# Altium footprint library Switches.PcbLib: 117 footprints (part 5 of 8) (continued)
## SW_DIPTRONICS_DHA-08TQ [mm] "Pitch 1.27mm,  Body 6.2x11.29mm, 8 Ways SPST Surface-Mount DIP Switch, DIPTRONICS DHA Series" (continued)
Mechanical 14:
  lines w0.1: -0.8,-4.899 -0.8,-3.999 ; -0.8,-3.629 -0.8,-2.729 ; -0.8,-2.359 -0.8,-1.459 ; -0.8,-1.089 -0.8,-0.189 ; -0.8,0.181 -0.8,1.081 ; -0.8,1.451 -0.8,2.351 ; -0.8,2.721 -0.8,3.621 ; -0.8,3.991 -0.8,4.891 ; -0.7,-4.899 -0.7,-3.999 ; -0.7,-3.629 -0.7,-2.729 ; -0.7,-2.359 -0.7,-1.459 ; -0.7,-1.089 -0.7,-0.189 ; -0.7,0.181 -0.7,1.081 ; -0.7,1.451 -0.7,2.351 ; -0.7,2.721 -0.7,3.621 ; -0.7,3.991 -0.7,4.891 ; -0.6,-4.899 -0.6,-3.999 ; -0.6,-3.629 -0.6,-2.729 ; -0.6,-2.359 -0.6,-1.459 ; -0.6,-1.089 -0.6,-0.189 ; -0.6,0.181 -0.6,1.081 ; -0.6,1.451 -0.6,2.351 ; -0.6,2.721 -0.6,3.621 ; -0.6,3.991 -0.6,4.891 ; -0.5,-4.899 -0.5,-3.999 ; -0.5,-3.629 -0.5,-2.729 ; -0.5,-2.359 -0.5,-1.459 ; -0.5,-1.089 -0.5,-0.189 ; -0.5,0.181 -0.5,1.081 ; -0.5,1.451 -0.5,2.351 ; -0.5,2.721 -0.5,3.621 ; -0.5,3.991 -0.5,4.891 ; -0.4,-4.899 -0.4,-3.999 ; -0.4,-3.629 -0.4,-2.729 ; -0.4,-2.359 -0.4,-1.459 ; -0.4,-1.089 -0.4,-0.189 ; -0.4,0.181 -0.4,1.081 ; -0.4,1.451 -0.4,2.351 ; -0.4,2.721 -0.4,3.621 ; -0.4,3.991 -0.4,4.891 ; -0.3,-4.899 -0.3,-3.999 ; -0.3,-3.629 -0.3,-2.729 ; -0.3,-2.359 -0.3,-1.459 ; -0.3,-1.089 -0.3,-0.189 ; -0.3,0.181 -0.3,1.081 ; -0.3,1.451 -0.3,2.351 ; -0.3,2.721 -0.3,3.621 ; -0.3,3.991 -0.3,4.891 ; -0.2,-4.899 -0.2,-3.999 ; -0.2,-3.629 -0.2,-2.729 ; -0.2,-2.359 -0.2,-1.459 ; -0.2,-1.089 -0.2,-0.189 ; -0.2,0.181 -0.2,1.081 ; -0.2,1.451 -0.2,2.351 ; -0.2,2.721 -0.2,3.621 ; -0.2,3.991 -0.2,4.891 ; -0.1,-4.899 -0.1,-3.999 ; -0.1,-3.629 -0.1,-2.729 ; -0.1,-2.359 -0.1,-1.459 ; -0.1,-1.089 -0.1,-0.189 ; -0.1,0.181 -0.1,1.081 ; -0.1,1.451 -0.1,2.351 ; -0.1,2.721 -0.1,3.621 ; -0.1,3.991 -0.1,4.891 ; 0,-4.899 0,-3.999 ; 0,-3.629 0,-2.729 ; 0,-2.359 0,-1.459 ; 0,-1.089 0,-0.189 ; 0,0.181 0,1.081 ; 0,1.451 0,2.351 ; 0,2.721 0,3.621 ; 0,3.991 0,4.891 ; 0.1,-4.899 0.1,-3.999 ; 0.1,-3.629 0.1,-2.729 ; 0.1,-2.359 0.1,-1.459 ; 0.1,-1.089 0.1,-0.189 ; 0.1,0.181 0.1,1.081 ; 0.1,1.451 0.1,2.351 ; 0.1,2.721 0.1,3.621 ; 0.1,3.991 0.1,4.891 ; -0.9,-4.899 -0.9,-3.999 ; -0.9,-4.899 0.9,-4.899 0.9,-3.999 -0.9,-3.999 ; -0.9,-4.899 -0.9,-3.999 ; -0.9,-3.629 -0.9,-2.729 ; -0.9,-3.629 0.9,-3.629 0.9,-2.729 -0.9,-2.729 ; -0.9,-3.629 -0.9,-2.729 ; -0.9,-2.359 -0.9,-1.459 ; -0.9,-2.359 0.9,-2.359 0.9,-1.459 -0.9,-1.459 ; -0.9,-2.359 -0.9,-1.459 ; -0.9,-1.089 -0.9,-0.189 ; -0.9,-1.089 0.9,-1.089 0.9,-0.189 -0.9,-0.189 ; -0.9,-1.089 -0.9,-0.189 ; -0.9,0.181 -0.9,1.081 ; -0.9,0.181 -0.9,1.081 ; -0.9,0.181 0.9,0.181 0.9,1.081 -0.9,1.081 ; -0.9,1.451 -0.9,2.351 ; -0.9,1.451 -0.9,2.351 ; -0.9,1.451 0.9,1.451 0.9,2.351 -0.9,2.351 ; -0.9,2.721 -0.9,3.621 ; -0.9,2.721 -0.9,3.621 ; -0.9,2.721 0.9,2.721 0.9,3.621 -0.9,3.621 ; -0.9,3.991 -0.9,4.891 ; -0.9,3.991 -0.9,4.891 ; -0.9,3.991 0.9,3.991 0.9,4.891 -0.9,4.891 ; -3.1,-5.645 3.1,-5.645 3.1,5.635 -3.1,5.635 -3.1,-5.645
  text "1" at -2.276,4.699 h1
  text "2" at -2.276,3.429 h1
  text "ON" at 1.28,5.08 h1
  text "3" at -2.276,2.159 h1
  text "4" at -2.276,0.889 h1
  text "5" at -2.276,-0.381 h1
  text "6" at -2.276,-1.651 h1
  text "7" at -2.276,-2.921 h1
  text "8" at -2.276,-4.191 h1
Mechanical 15:
  lines w0.05: -4.695,-5.895 -4.695,5.895 4.695,5.895 4.695,-5.895 -4.695,-5.895
3D body "SW_DIPTRONICS_DHA-08TQ.stp": height 2.36, standoff 0, extent -4.05,-5.645 4.051,5.645

## SW_EAO_1K2-09.032 [mm] "Body 10x2.5mm, SPDT Switch - PCB Mounting - EAO Series 1K2"
height 8.1
pads (3):
  round 1.6 hole 0.9: 1(0,0) 2(0,-2.54) 3(0,2.54)
Top Overlay:
  circle w0.2: c0,4.023 r0.4
  circle w0.4: c0,5.7 r0.2
  lines w0.2: -1.25,3.046 -0.9,3.046 ; -1.1,-2.154 -1.2,-2.154 -1.2,0.246 -1.1,0.246 ; -0.498,-1.002 ccw(c0,-0.954) 0.498,-1.002 ; 0.9,3.046 1.25,3.046 ; 1.1,-2.154 1.2,-2.154 1.2,0.246 1.1,0.246 ; -1.25,-5 -1.25,5 1.25,5 1.25,-5 -1.25,-5
Mechanical 14:
  circle w0.1: c0,4.023 r0.5
  circle w0.1: c0,-0.954 r0.5
  lines w0.1: -1.25,3.046 1.25,3.046 ; -1.25,-5 -1.25,5 1.25,5 1.25,-5 -1.25,-5 ; -1.2,-2.154 -1.2,0.246 1.2,0.246 1.2,-2.154 -1.2,-2.154
3D body "SW_EAO_1K2-09.032.stp": height 6.4, standoff -3.8, extent -1.25,-5 1.25,5

## SW_EAO_09.10201.02 [mm] "Body 10x2.5mm, Right Angled SPDT Switch - PCB Mounting - EAO Series 1K2"
height 2.5
pads (3):
  round 1.4 hole 0.9: 1(0,0) 2(0,-2.54) 3(0,2.54)
Top Overlay:
  circle w0.4: c0,5.7 r0.2
  lines w0.2: -5.7,-5 -5.7,5 -0.7,5 -0.7,4.5 -1.2,4.5 -1.2,-4.5 -0.7,-4.5 -0.7,-5 -6.1,-5 -6.6,-1.9 -7.1,-1.9 -7.1,0.5 -6.6,0.5 -6.1,3.6 -5.7,3.6
Mechanical 8:
  lines w0.1: -1,-2.54 0,-2.54 ; -1,0 0,0 ; -1,2.54 0,2.54 ; 0,-3.54 0,-2.54 ; 0,-1.54 0,-2.54 ; 0,-1 0,0 ; 0,1 0,0 ; 0,1.54 0,2.54 ; 0,3.54 0,2.54 ; 1,-2.54 0,-2.54 ; 1,0 0,0 ; 1,2.54 0,2.54
Mechanical 14:
  lines w0.1: -5.7,-5 -5.7,5 -0.7,5 -0.7,4.5 -1.2,4.5 -1.2,-4.5 -0.7,-4.5 -0.7,-5 -6.1,-5 -6.6,-1.9 -7.1,-1.9 -7.1,0.5 -6.6,0.5 -6.1,3.6 -5.7,3.6
3D body "SW_EAO_09.10201.02.stp": height 2.5, standoff -3.5, extent -7.1,-5 0.3,5

## SW_EOZ-INTERDIL_09.20000.39 [mm] "10.16x5mm, DPST DIP Switch, (Output in Sealed, and Wave Soldering) INTERDIL Series, EOZ / INTERDIL Series"
height 8.2
pads (4):
  round 1.5 hole 0.8: 1(-3.81,1.27) 2(3.81,1.27) 3(-3.81,-1.27) 4(3.81,-1.27)
Top Overlay:
  lines w0.2: 0.109,-0.52 -2.5,-0.52 -2.5,-2.02 0.115,-2.02 ; 0.109,0.52 -2.5,0.52 -2.5,2.02 0.115,2.02 ; 1.045,-2.02 2.5,-2.02 2.5,-0.52 1.051,-0.52 ; 1.045,2.02 2.5,2.02 2.5,0.52 1.051,0.52 ; -5.08,-2.5 5.08,-2.5 5.08,2.5 -5.08,2.5 -5.08,-2.5 ; 0.08,-2.4 0.18,-1.3 0.08,-0.2 1.08,-0.2 0.98,-1.3 1.08,-2.4 0.08,-2.4 ; 0.08,0.2 0.18,1.3 0.08,2.4 1.08,2.4 0.98,1.3 1.08,0.2 0.08,0.2
Mechanical 8:
  lines w0.1: -4.81,-1.27 -3.81,-1.27 ; -4.81,1.27 -3.81,1.27 ; -3.81,-2.27 -3.81,-1.27 ; -3.81,-0.27 -3.81,-1.27 ; -3.81,0.27 -3.81,1.27 ; -3.81,2.27 -3.81,1.27 ; -2.81,-1.27 -3.81,-1.27 ; -2.81,1.27 -3.81,1.27 ; -1,0 0,0 ; 0,-1 0,0 ; 0,1 0,0 ; 1,0 0,0 ; 2.81,-1.27 3.81,-1.27 ; 2.81,1.27 3.81,1.27 ; 3.81,-2.27 3.81,-1.27 ; 3.81,-0.27 3.81,-1.27 ; 3.81,0.27 3.81,1.27 ; 3.81,2.27 3.81,1.27 ; 4.81,-1.27 3.81,-1.27 ; 4.81,1.27 3.81,1.27
Mechanical 14:
  lines w0.1: 0.109,-0.52 -2.5,-0.52 -2.5,-2.02 0.115,-2.02 ; 0.109,0.52 -2.5,0.52 -2.5,2.02 0.115,2.02 ; 1.045,-2.02 2.5,-2.02 2.5,-0.52 1.051,-0.52 ; 1.045,2.02 2.5,2.02 2.5,0.52 1.051,0.52 ; -5.08,-2.5 5.08,-2.5 5.08,2.5 -5.08,2.5 -5.08,-2.5 ; 0.08,-2.4 0.18,-1.3 0.08,-0.2 1.08,-0.2 0.98,-1.3 1.08,-2.4 0.08,-2.4 ; 0.08,0.2 0.18,1.3 0.08,2.4 1.08,2.4 0.98,1.3 1.08,0.2 0.08,0.2
3D body "SW_EOZ-INTERDIL_09.20000.39.stp": height 8.2, standoff -3.6, extent -5.08,-2.5 5.08,2.5

## SW_EOZ-INTERDIL_09.40000.03 [mm] "10.16x5mm, Coupled SPST DIP Switch, 1NO + 1NF, INTERDIL Series"
height 8.2
pads (4):
  round 1.5 hole 0.8: 1(-3.81,1.27) 2(3.81,1.27) 3(-3.81,-1.27) 4(3.81,-1.27)
Top Overlay:
  lines w0.2: 0.109,-0.52 -2.5,-0.52 -2.5,-2.02 0.115,-2.02 ; 0.109,0.52 -2.5,0.52 -2.5,2.02 0.115,2.02 ; 1.045,-2.02 2.5,-2.02 2.5,-0.52 1.051,-0.52 ; 1.045,2.02 2.5,2.02 2.5,0.52 1.051,0.52 ; -5.08,-2.5 5.08,-2.5 5.08,2.5 -5.08,2.5 -5.08,-2.5 ; 0.08,-2.4 0.18,-1.3 0.08,-0.2 1.08,-0.2 0.98,-1.3 1.08,-2.4 0.08,-2.4 ; 0.08,0.2 0.18,1.3 0.08,2.4 1.08,2.4 0.98,1.3 1.08,0.2 0.08,0.2
Mechanical 8:
  lines w0.1: -4.81,-1.27 -3.81,-1.27 ; -4.81,1.27 -3.81,1.27 ; -3.81,-2.27 -3.81,-1.27 ; -3.81,-0.27 -3.81,-1.27 ; -3.81,0.27 -3.81,1.27 ; -3.81,2.27 -3.81,1.27 ; -2.81,-1.27 -3.81,-1.27 ; -2.81,1.27 -3.81,1.27 ; -1,0 0,0 ; 0,-1 0,0 ; 0,1 0,0 ; 1,0 0,0 ; 2.81,-1.27 3.81,-1.27 ; 2.81,1.27 3.81,1.27 ; 3.81,-2.27 3.81,-1.27 ; 3.81,-0.27 3.81,-1.27 ; 3.81,0.27 3.81,1.27 ; 3.81,2.27 3.81,1.27 ; 4.81,-1.27 3.81,-1.27 ; 4.81,1.27 3.81,1.27
Mechanical 14:
  lines w0.1: 0.109,-0.52 -2.5,-0.52 -2.5,-2.02 0.115,-2.02 ; 0.109,0.52 -2.5,0.52 -2.5,2.02 0.115,2.02 ; 1.045,-2.02 2.5,-2.02 2.5,-0.52 1.051,-0.52 ; 1.045,2.02 2.5,2.02 2.5,0.52 1.051,0.52 ; -5.08,-2.5 5.08,-2.5 5.08,2.5 -5.08,2.5 -5.08,-2.5 ; 0.08,-2.4 0.18,-1.3 0.08,-0.2 1.08,-0.2 0.98,-1.3 1.08,-2.4 0.08,-2.4 ; 0.08,0.2 0.18,1.3 0.08,2.4 1.08,2.4 0.98,1.3 1.08,0.2 0.08,0.2
3D body "SW_EOZ-INTERDIL_09.40000.03.stp": height 8.2, standoff -3.6, extent -5.08,-2.5 5.08,2.5

## SW_ERG_DS16C1-8 [mm] "PackageDescription  Body 22.7x9.9mm, Pitch 2.54mm, 1 Pole 8 Ways (SP8T), Thru Hole DIP Switch, ERG DS16C Serie"
height 9.3
pads (16):
  round 1.3 hole 0.8: 1(-3.81,8.89) 2(-3.81,6.35) 3(-3.81,3.81) 4(-3.81,1.27) 5(-3.81,-1.27) 6(-3.81,-3.81) 7(-3.81,-6.35) 8(-3.81,-8.89) 9(3.81,-8.89) 10(3.81,-6.35) 11(3.81,-3.81) 12(3.81,-1.27) 13(3.81,1.27) 14(3.81,3.81) 15(3.81,6.35) 16(3.81,8.89)
Top Overlay:
  lines w0.2: -4,-9.821 -4,-10.5 4,-10.5 4,-9.821 ; -4,-7.959 -4,-7.281 ; -4,-5.419 -4,-4.741 ; -4,-2.879 -4,-2.201 ; -4,-0.339 -4,0.339 ; -4,2.201 -4,2.879 ; -4,4.741 -4,5.419 ; -4,7.281 -4,7.959 ; -4,9.821 -4,10.5 4,10.5 4,9.821 ; -1.6,-7.35 1.6,-7.35 ; -1.6,-6.86 1.6,-6.86 ; -1.6,-6.68 1.6,-6.68 ; -1.6,-6.02 1.6,-6.02 ; -1.6,-5.84 1.6,-5.84 ; -1.6,-5.35 1.6,-5.35 ; -0.4,-9.4 -0.4,-7.35 ; -0.4,-5.35 -0.4,9.4 ; 0.4,-9.4 0.4,-7.35 ; 0.4,-5.35 0.4,9.4 ; 4,-7.959 4,-7.281 ; 4,-5.419 4,-4.741 ; 4,-2.879 4,-2.201 ; 4,-0.339 4,0.339 ; 4,2.201 4,2.879 ; 4,4.741 4,5.419 ; 4,7.281 4,7.959 ; -4.95,-11.7 4.95,-11.7 4.95,11 -4.95,11 -4.95,-11.7 ; -1.6,-9.4 -1.6,9.4 1.6,9.4 1.6,-9.4 -1.6,-9.4
  text "8" at -2.867,-8.509 h1
  text "7" at -2.867,-5.969 h1
  text "6" at -2.867,-3.429 h1
  text "4" at -2.867,1.651 h1
  text "5" at -2.867,-0.889 h1
  text "2" at -2.867,6.731 h1
  text "3" at -2.867,4.191 h1
  text "1" at -2.867,9.017 h1
Mechanical 8:
  lines w0.1: -0.5,0 0,0 ; 0,-0.5 0,0 ; 0,0.5 0,0 ; 0.5,0 0,0
Mechanical 14:
  lines w0.1: -4.31,-8.89 -3.81,-8.89 ; -4.31,-6.35 -3.81,-6.35 ; -4.31,-3.81 -3.81,-3.81 ; -4.31,-1.27 -3.81,-1.27 ; -4.31,1.27 -3.81,1.27 ; -4.31,3.81 -3.81,3.81 ; -4.31,6.35 -3.81,6.35 ; -4.31,8.89 -3.81,8.89 ; -3.81,-9.39 -3.81,-8.89 ; -3.81,-8.39 -3.81,-8.89 ; -3.81,-6.85 -3.81,-6.35 ; -3.81,-5.85 -3.81,-6.35 ; -3.81,-4.31 -3.81,-3.81 ; -3.81,-3.31 -3.81,-3.81 ; -3.81,-1.77 -3.81,-1.27 ; -3.81,-0.77 -3.81,-1.27 ; -3.81,0.77 -3.81,1.27 ; -3.81,1.77 -3.81,1.27 ; -3.81,3.31 -3.81,3.81 ; -3.81,4.31 -3.81,3.81 ; -3.81,5.85 -3.81,6.35 ; -3.81,6.85 -3.81,6.35 ; -3.81,8.39 -3.81,8.89 ; -3.81,9.39 -3.81,8.89 ; -3.31,-8.89 -3.81,-8.89 ; -3.31,-6.35 -3.81,-6.35 ; -3.31,-3.81 -3.81,-3.81 ; -3.31,-1.27 -3.81,-1.27 ; -3.31,1.27 -3.81,1.27 ; -3.31,3.81 -3.81,3.81 ; -3.31,6.35 -3.81,6.35 ; -3.31,8.89 -3.81,8.89 ; -1.6,-7.35 1.6,-7.35 ; -1.6,-6.86 1.6,-6.86 ; -1.6,-6.68 1.6,-6.68 ; -1.6,-6.02 1.6,-6.02 ; -1.6,-5.84 1.6,-5.84 ; -1.6,-5.35 1.6,-5.35 ; -0.4,-9.4 -0.4,-7.35 ; -0.4,-5.35 -0.4,9.4 ; 0.4,-9.4 0.4,-7.35 ; 0.4,-5.35 0.4,9.4 ; 3.31,-8.89 3.81,-8.89 ; 3.31,-6.35 3.81,-6.35 ; 3.31,-3.81 3.81,-3.81 ; 3.31,-1.27 3.81,-1.27 ; 3.31,1.27 3.81,1.27 ; 3.31,3.81 3.81,3.81 ; 3.31,6.35 3.81,6.35 ; 3.31,8.89 3.81,8.89 ; 3.81,-9.39 3.81,-8.89 ; 3.81,-8.39 3.81,-8.89 ; 3.81,-6.85 3.81,-6.35 ; 3.81,-5.85 3.81,-6.35 ; 3.81,-4.31 3.81,-3.81 ; 3.81,-3.31 3.81,-3.81 ; 3.81,-1.77 3.81,-1.27 ; 3.81,-0.77 3.81,-1.27 ; 3.81,0.77 3.81,1.27 ; 3.81,1.77 3.81,1.27 ; 3.81,3.31 3.81,3.81 ; 3.81,4.31 3.81,3.81 ; 3.81,5.85 3.81,6.35 ; 3.81,6.85 3.81,6.35 ; 3.81,8.39 3.81,8.89 ; 3.81,9.39 3.81,8.89 ; 4.31,-8.89 3.81,-8.89 ; 4.31,-6.35 3.81,-6.35 ; 4.31,-3.81 3.81,-3.81 ; 4.31,-1.27 3.81,-1.27 ; 4.31,1.27 3.81,1.27 ; 4.31,3.81 3.81,3.81 ; 4.31,6.35 3.81,6.35 ; 4.31,8.89 3.81,8.89 ; -4.95,-11.7 4.95,-11.7 4.95,11 -4.95,11 -4.95,-11.7 ; -4,-10.5 -4,10.5 4,10.5 4,-10.5 -4,-10.5 ; -1.6,-9.4 -1.6,9.4 1.6,9.4 1.6,-9.4 -1.6,-9.4
  text "8" at -2.867,-8.509 h1
  text "7" at -2.867,-5.969 h1
  text "6" at -2.867,-3.429 h1
  text "4" at -2.867,1.651 h1
  text "5" at -2.867,-0.889 h1
  text "2" at -2.867,6.731 h1
  text "3" at -2.867,4.191 h1
  text "1" at -2.867,9.017 h1
3D body "SW_ERG_DS16C1-8.stp": height 9.9, standoff -3.2, extent -4.95,-11.7 4.95,11

## SW_ERG_SCS-2-023 [mm] "Body 6.7x10.5mm, Pitch 2.54mm, 2 Way SPDT, Thru Hole DIP Switch, ERG Spectra C-023 Style"
height 9
pads (6):
  round 1.6 hole 0.9: 1(-2.54,1.27) 2(-2.54,-1.27) 3(5.08,-1.27) 4(5.08,1.27) C1(0,1.27) C2(0,-1.27)
Top Overlay:
  lines w0.2: -1.491,-1.599 -1.22,-1.87 -0.922,-1.87 ; -1.491,-0.941 -1.22,-0.67 -0.922,-0.67 ; -1.491,0.941 -1.22,0.67 -0.922,0.67 ; -1.491,1.599 -1.22,1.87 -0.922,1.87 ; -0.262,-2.338 -0.28,-2.42 1.22,-2.42 1.045,-1.614 ; -0.262,-0.202 -0.28,-0.12 1.22,-0.12 1.045,-0.926 ; -0.262,0.202 -0.28,0.12 1.22,0.12 1.045,0.926 ; -0.262,2.338 -0.28,2.42 1.22,2.42 1.045,1.614 ; 1.1,-1.87 2.78,-1.87 3.38,-1.27 2.78,-0.67 1.1,-0.67 ; 1.1,0.67 2.78,0.67 3.38,1.27 2.78,1.87 1.1,1.87 ; -3.98,-3.35 -3.98,3.35 6.52,3.35 6.52,-3.35 -3.98,-3.35
  text "2" at -5.48,-0.929 h1
  text "1" at -5.48,1.357 h1
Mechanical 8:
  lines w0.05: -2.54,-1.77 -2.54,-1.27 -2.04,-1.27 ; -2.54,0.77 -2.54,1.27 -2.04,1.27 ; 0,-1.77 0,-1.27 0.5,-1.27 ; 0,-0.5 0,0 0.5,0 ; 0,0.77 0,1.27 0.5,1.27 ; 5.08,-1.77 5.08,-1.27 5.58,-1.27 ; 5.08,0.77 5.08,1.27 5.58,1.27
Mechanical 14:
  lines w0.1: -0.16,-1.87 -1.22,-1.87 -1.82,-1.27 -1.22,-0.67 -0.16,-0.67 ; -0.16,0.67 -1.22,0.67 -1.82,1.27 -1.22,1.87 -0.16,1.87 ; 1.1,-1.87 2.78,-1.87 3.38,-1.27 2.78,-0.67 1.1,-0.67 ; 1.1,0.67 2.78,0.67 3.38,1.27 2.78,1.87 1.1,1.87 ; -3.98,-3.35 -3.98,3.35 6.52,3.35 6.52,-3.35 -3.98,-3.35 ; -3.38,-2.75 -3.38,2.75 5.92,2.75 5.92,-2.75 -3.38,-2.75 ; -0.28,-2.42 -0.03,-1.27 -0.28,-0.12 1.22,-0.12 0.97,-1.27 1.22,-2.42 -0.28,-2.42 ; -0.28,0.12 -0.03,1.27 -0.28,2.42 1.22,2.42 0.97,1.27 1.22,0.12 -0.28,0.12
3D body "SW_ERG_SCS-2-023.stp": height 9, standoff -3.6, extent -3.98,-3.35 6.52,3.35

## SW_ERG_SCS-4-023 [mm] "Body 11.8x10.5mm, Pitch 2.54mm, 4 Way SPDT, Thru Hole DIP Switch, ERG Spectra C-023 Style"
height 9
pads (12):
  round 1.6 hole 0.9: 1(-2.54,3.81) 2(-2.54,1.27) 3(-2.54,-1.27) 4(-2.54,-3.81) 5(5.08,-3.81) 6(5.08,-1.27) 7(5.08,1.27) 8(5.08,3.81) C1(0,3.81) C2(0,1.27) C3(0,-1.27) C4(0,-3.81)
Top Overlay:
  lines w0.2: -1.491,-4.139 -1.22,-4.41 -0.922,-4.41 ; -1.491,-3.481 -1.22,-3.21 -0.922,-3.21 ; -1.491,-1.599 -1.22,-1.87 -0.922,-1.87 ; -1.491,-0.941 -1.22,-0.67 -0.922,-0.67 ; -1.491,0.941 -1.22,0.67 -0.922,0.67 ; -1.491,1.599 -1.22,1.87 -0.922,1.87 ; -1.491,3.481 -1.22,3.21 -0.922,3.21 ; -1.491,4.139 -1.22,4.41 -0.922,4.41 ; -0.262,-4.878 -0.28,-4.96 1.22,-4.96 1.045,-4.154 ; -0.262,-2.742 -0.28,-2.66 1.22,-2.66 1.045,-3.466 ; -0.262,-2.338 -0.28,-2.42 1.22,-2.42 1.045,-1.614 ; -0.262,-0.202 -0.28,-0.12 1.22,-0.12 1.045,-0.926 ; -0.262,0.202 -0.28,0.12 1.22,0.12 1.045,0.926 ; -0.262,2.338 -0.28,2.42 1.22,2.42 1.045,1.614 ; -0.262,2.742 -0.28,2.66 1.22,2.66 1.045,3.466 ; -0.262,4.878 -0.28,4.96 1.22,4.96 1.045,4.154 ; 1.1,-4.41 2.78,-4.41 3.38,-3.81 2.78,-3.21 1.1,-3.21 ; 1.1,-1.87 2.78,-1.87 3.38,-1.27 2.78,-0.67 1.1,-0.67 ; 1.1,0.67 2.78,0.67 3.38,1.27 2.78,1.87 1.1,1.87 ; 1.1,3.21 2.78,3.21 3.38,3.81 2.78,4.41 1.1,4.41 ; -3.98,-5.93 6.52,-5.93 6.52,5.87 -3.98,5.87 -3.98,-5.93
  text "4" at -5.48,-3.479 h1
  text "2" at -5.48,1.601 h1
  text "3" at -5.48,-0.939 h1
  text "1" at -5.48,3.887 h1
Mechanical 8:
  lines w0.1: -3.04,-3.81 -2.54,-3.81 ; -3.04,-1.27 -2.54,-1.27 ; -3.04,1.27 -2.54,1.27 ; -3.04,3.81 -2.54,3.81 ; -2.54,-4.31 -2.54,-3.81 ; -2.54,-3.31 -2.54,-3.81 ; -2.54,-1.77 -2.54,-1.27 ; -2.54,-0.77 -2.54,-1.27 ; -2.54,0.77 -2.54,1.27 ; -2.54,1.77 -2.54,1.27 ; -2.54,3.31 -2.54,3.81 ; -2.54,4.31 -2.54,3.81 ; -2.04,-3.81 -2.54,-3.81 ; -2.04,-1.27 -2.54,-1.27 ; -2.04,1.27 -2.54,1.27 ; -2.04,3.81 -2.54,3.81 ; -0.5,-3.81 0,-3.81 ; -0.5,-1.27 0,-1.27 ; -0.5,0 0,0 ; -0.5,1.27 0,1.27 ; -0.5,3.81 0,3.81 ; 0,-4.31 0,-3.81 ; 0,-3.31 0,-3.81 ; 0,-1.77 0,-1.27 ; 0,-0.77 0,-1.27 ; 0,-0.5 0,0 ; 0,0.5 0,0 ; 0,0.77 0,1.27 ; 0,1.77 0,1.27 ; 0,3.31 0,3.81 ; 0,4.31 0,3.81 ; 0.5,-3.81 0,-3.81 ; 0.5,-1.27 0,-1.27 ; 0.5,0 0,0 ; 0.5,1.27 0,1.27 ; 0.5,3.81 0,3.81 ; 1.27,-5.08 1.27,-4.58 ; 4.58,-3.81 5.08,-3.81 ; 4.58,-1.27 5.08,-1.27 ; 4.58,1.27 5.08,1.27 ; 4.58,3.81 5.08,3.81 ; 5.08,-4.31 5.08,-3.81 ; 5.08,-3.31 5.08,-3.81 ; 5.08,-1.77 5.08,-1.27 ; 5.08,-0.77 5.08,-1.27 ; 5.08,0.77 5.08,1.27 ; 5.08,1.77 5.08,1.27 ; 5.08,3.31 5.08,3.81 ; 5.08,4.31 5.08,3.81 ; 5.58,-3.81 5.08,-3.81 ; 5.58,-1.27 5.08,-1.27 ; 5.58,1.27 5.08,1.27 ; 5.58,3.81 5.08,3.81
Mechanical 14:
  lines w0.1: -0.16,-4.41 -1.22,-4.41 -1.82,-3.81 -1.22,-3.21 -0.16,-3.21 ; -0.16,-1.87 -1.22,-1.87 -1.82,-1.27 -1.22,-0.67 -0.16,-0.67 ; -0.16,0.67 -1.22,0.67 -1.82,1.27 -1.22,1.87 -0.16,1.87 ; -0.16,3.21 -1.22,3.21 -1.82,3.81 -1.22,4.41 -0.16,4.41 ; 1.1,-4.41 2.78,-4.41 3.38,-3.81 2.78,-3.21 1.1,-3.21 ; 1.1,-1.87 2.78,-1.87 3.38,-1.27 2.78,-0.67 1.1,-0.67 ; 1.1,0.67 2.78,0.67 3.38,1.27 2.78,1.87 1.1,1.87 ; 1.1,3.21 2.78,3.21 3.38,3.81 2.78,4.41 1.1,4.41 ; -3.98,-5.93 6.52,-5.93 6.52,5.87 -3.98,5.87 -3.98,-5.93 ; -3.38,-5.33 5.92,-5.33 5.92,5.27 -3.38,5.27 -3.38,-5.33 ; -0.28,-4.96 1.22,-4.96 0.97,-3.81 1.22,-2.66 -0.28,-2.66 -0.03,-3.81 -0.28,-4.96 ; -0.28,-2.42 1.22,-2.42 0.97,-1.27 1.22,-0.12 -0.28,-0.12 -0.03,-1.27 -0.28,-2.42 ; -0.28,0.12 1.22,0.12 0.97,1.27 1.22,2.42 -0.28,2.42 -0.03,1.27 -0.28,0.12 ; -0.28,2.66 1.22,2.66 0.97,3.81 1.22,4.96 -0.28,4.96 -0.03,3.81 -0.28,2.66
3D body "SW_ERG_SCS-4-023.stp": height 9, standoff -3.6, extent -3.98,-5.93 6.52,5.87

## SW_ERG_SCS-6-023 [mm] "Body 16.8x10.5mm, Pitch 2.54mm, 6 Way SPDT, Thru Hole DIP Switch, ERG Spectra C-023 Style"
height 9
pads (18):
  round 1.6 hole 0.9: 1(-3.81,6.35) 2(-3.81,3.81) 3(-3.81,1.27) 4(-3.81,-1.27) 5(-3.81,-3.81) 6(-3.81,-6.35) 7(3.81,-6.35) 8(3.81,-3.81) 9(3.81,-1.27) 10(3.81,1.27) 11(3.81,3.81) 12(3.81,6.35) C1(-1.27,6.35) C2(-1.27,3.81) C3(-1.27,1.27) C4(-1.27,-1.27) C5(-1.27,-3.81) C6(-1.27,-6.35)
Top Overlay:
  lines w0.2: -2.76,-6.689 -2.49,-6.96 -2.192,-6.96 ; -2.76,-6.031 -2.49,-5.76 -2.192,-5.76 ; -2.76,-4.149 -2.49,-4.42 -2.192,-4.42 ; -2.76,-3.491 -2.49,-3.22 -2.192,-3.22 ; -2.76,-1.609 -2.49,-1.88 -2.192,-1.88 ; -2.76,-0.951 -2.49,-0.68 -2.192,-0.68 ; -2.76,0.931 -2.49,0.66 -2.192,0.66 ; -2.76,1.589 -2.49,1.86 -2.192,1.86 ; -2.76,3.471 -2.49,3.2 -2.192,3.2 ; -2.76,4.129 -2.49,4.4 -2.192,4.4 ; -2.76,6.011 -2.49,5.74 -2.192,5.74 ; -2.76,6.669 -2.49,6.94 -2.192,6.94 ; -1.532,-7.428 -1.55,-7.51 -0.05,-7.51 -0.225,-6.704 ; -1.532,-5.292 -1.55,-5.21 -0.05,-5.21 -0.225,-6.016 ; -1.532,-4.888 -1.55,-4.97 -0.05,-4.97 -0.225,-4.164 ; -1.532,-2.752 -1.55,-2.67 -0.05,-2.67 -0.225,-3.476 ; -1.532,-2.348 -1.55,-2.43 -0.05,-2.43 -0.225,-1.624 ; -1.532,-0.212 -1.55,-0.13 -0.05,-0.13 -0.225,-0.936 ; -1.532,0.192 -1.55,0.11 -0.05,0.11 -0.225,0.916 ; -1.532,2.328 -1.55,2.41 -0.05,2.41 -0.225,1.604 ; -1.532,2.732 -1.55,2.65 -0.05,2.65 -0.225,3.456 ; -1.532,4.868 -1.55,4.95 -0.05,4.95 -0.225,4.144 ; -1.532,5.272 -1.55,5.19 -0.05,5.19 -0.225,5.996 ; -1.532,7.408 -1.55,7.49 -0.05,7.49 -0.225,6.684 ; -0.17,-6.96 1.51,-6.96 2.11,-6.36 1.51,-5.76 -0.17,-5.76 ; -0.17,-4.42 1.51,-4.42 2.11,-3.82 1.51,-3.22 -0.17,-3.22 ; -0.17,-1.88 1.51,-1.88 2.11,-1.28 1.51,-0.68 -0.17,-0.68 ; -0.17,0.66 1.51,0.66 2.11,1.26 1.51,1.86 -0.17,1.86 ; -0.17,3.2 1.51,3.2 2.11,3.8 1.51,4.4 -0.17,4.4 ; -0.17,5.74 1.51,5.74 2.11,6.34 1.51,6.94 -0.17,6.94 ; -5.25,-8.4 -5.25,8.4 5.25,8.4 5.25,-8.4 -5.25,-8.4
  text "1" at -6.75,6.427 h1
  text "3" at -6.75,1.601 h1
  text "2" at -6.75,4.141 h1
  text "5" at -6.75,-3.479 h1
  text "4" at -6.75,-0.939 h1
  text "6" at -6.75,-6.019 h1
Mechanical 8:
  lines w0.1: -4.31,-6.36 -3.81,-6.36 ; -4.31,-3.82 -3.81,-3.82 ; -4.31,-1.28 -3.81,-1.28 ; -4.31,1.26 -3.81,1.26 ; -4.31,3.8 -3.81,3.8 ; -4.31,6.34 -3.81,6.34 ; -3.81,-6.86 -3.81,-6.36 ; -3.81,-5.86 -3.81,-6.36 ; -3.81,-4.32 -3.81,-3.82 ; -3.81,-3.32 -3.81,-3.82 ; -3.81,-1.78 -3.81,-1.28 ; -3.81,-0.78 -3.81,-1.28 ; -3.81,0.76 -3.81,1.26 ; -3.81,1.76 -3.81,1.26 ; -3.81,3.3 -3.81,3.8 ; -3.81,4.3 -3.81,3.8 ; -3.81,5.84 -3.81,6.34 ; -3.81,6.84 -3.81,6.34 ; -3.31,-6.36 -3.81,-6.36 ; -3.31,-3.82 -3.81,-3.82 ; -3.31,-1.28 -3.81,-1.28 ; -3.31,1.26 -3.81,1.26 ; -3.31,3.8 -3.81,3.8 ; -3.31,6.34 -3.81,6.34 ; -1.77,-6.36 -1.27,-6.36 ; -1.77,-3.82 -1.27,-3.82 ; -1.77,-1.28 -1.27,-1.28 ; -1.77,1.26 -1.27,1.26 ; -1.77,3.8 -1.27,3.8 ; -1.77,6.34 -1.27,6.34 ; -1.27,-6.86 -1.27,-6.36 ; -1.27,-5.86 -1.27,-6.36 ; -1.27,-4.32 -1.27,-3.82 ; -1.27,-3.32 -1.27,-3.82 ; -1.27,-1.78 -1.27,-1.28 ; -1.27,-0.78 -1.27,-1.28 ; -1.27,0.76 -1.27,1.26 ; -1.27,1.76 -1.27,1.26 ; -1.27,3.3 -1.27,3.8 ; -1.27,4.3 -1.27,3.8 ; -1.27,5.84 -1.27,6.34 ; -1.27,6.84 -1.27,6.34 ; -0.77,-6.36 -1.27,-6.36 ; -0.77,-3.82 -1.27,-3.82 ; -0.77,-1.28 -1.27,-1.28 ; -0.77,1.26 -1.27,1.26 ; -0.77,3.8 -1.27,3.8 ; -0.77,6.34 -1.27,6.34 ; -0.5,0 0,0 ; 0,-0.5 0,0 ; 0,0.5 0,0 ; 0.5,0 0,0 ; 3.31,-6.36 3.81,-6.36 ; 3.31,-3.82 3.81,-3.82 ; 3.31,-1.28 3.81,-1.28 ; 3.31,1.26 3.81,1.26 ; 3.31,3.8 3.81,3.8 ; 3.31,6.34 3.81,6.34 ; 3.81,-6.86 3.81,-6.36 ; 3.81,-5.86 3.81,-6.36 ; 3.81,-4.32 3.81,-3.82 ; 3.81,-3.32 3.81,-3.82 ; 3.81,-1.78 3.81,-1.28 ; 3.81,-0.78 3.81,-1.28 ; 3.81,0.76 3.81,1.26 ; 3.81,1.76 3.81,1.26 ; 3.81,3.3 3.81,3.8 ; 3.81,4.3 3.81,3.8 ; 3.81,5.84 3.81,6.34 ; 3.81,6.84 3.81,6.34 ; 4.31,-6.36 3.81,-6.36 ; 4.31,-3.82 3.81,-3.82 ; 4.31,-1.28 3.81,-1.28 ; 4.31,1.26 3.81,1.26 ; 4.31,3.8 3.81,3.8 ; 4.31,6.34 3.81,6.34
Mechanical 14:
  lines w0.1: -1.43,-6.96 -2.49,-6.96 -3.09,-6.36 -2.49,-5.76 -1.43,-5.76 ; -1.43,-4.42 -2.49,-4.42 -3.09,-3.82 -2.49,-3.22 -1.43,-3.22 ; -1.43,-1.88 -2.49,-1.88 -3.09,-1.28 -2.49,-0.68 -1.43,-0.68 ; -1.43,0.66 -2.49,0.66 -3.09,1.26 -2.49,1.86 -1.43,1.86 ; -1.43,3.2 -2.49,3.2 -3.09,3.8 -2.49,4.4 -1.43,4.4 ; -1.43,5.74 -2.49,5.74 -3.09,6.34 -2.49,6.94 -1.43,6.94 ; -0.17,-6.96 1.51,-6.96 2.11,-6.36 1.51,-5.76 -0.17,-5.76 ; -0.17,-4.42 1.51,-4.42 2.11,-3.82 1.51,-3.22 -0.17,-3.22 ; -0.17,-1.88 1.51,-1.88 2.11,-1.28 1.51,-0.68 -0.17,-0.68 ; -0.17,0.66 1.51,0.66 2.11,1.26 1.51,1.86 -0.17,1.86 ; -0.17,3.2 1.51,3.2 2.11,3.8 1.51,4.4 -0.17,4.4 ; -0.17,5.74 1.51,5.74 2.11,6.34 1.51,6.94 -0.17,6.94 ; -5.25,-8.4 -5.25,8.4 5.25,8.4 5.25,-8.4 -5.25,-8.4 ; -4.65,-7.8 -4.65,7.8 4.65,7.8 4.65,-7.8 -4.65,-7.8 ; -1.55,-7.51 -1.3,-6.36 -1.55,-5.21 -0.05,-5.21 -0.3,-6.36 -0.05,-7.51 -1.55,-7.51 ; -1.55,-4.97 -1.3,-3.82 -1.55,-2.67 -0.05,-2.67 -0.3,-3.82 -0.05,-4.97 -1.55,-4.97 ; -1.55,-2.43 -1.3,-1.28 -1.55,-0.13 -0.05,-0.13 -0.3,-1.28 -0.05,-2.43 -1.55,-2.43 ; -1.55,0.11 -1.3,1.26 -1.55,2.41 -0.05,2.41 -0.3,1.26 -0.05,0.11 -1.55,0.11 ; -1.55,2.65 -1.3,3.8 -1.55,4.95 -0.05,4.95 -0.3,3.8 -0.05,2.65 -1.55,2.65 ; -1.55,5.19 -1.3,6.34 -1.55,7.49 -0.05,7.49 -0.3,6.34 -0.05,5.19 -1.55,5.19
  text "1" at 3.2,6.502 h1
  text "3" at 3.2,1.676 h1
  text "2" at 3.2,4.216 h1
  text "5" at 3.2,-3.404 h1
  text "4" at 3.2,-0.864 h1
  text "6" at 3.2,-5.944 h1
3D body "SW_ERG_SCS-6-023.stp": height 9, standoff -3.6, extent -5.25,-8.4 5.25,8.4